# Altium footprint library Connectors_THT.PcbLib: 103 footprints (part 11 of 11)
Each footprint in its own frame and in the unit in brackets; x right, y up, seen from the top. Pads: shape width x height; smd on the part's side, far side on the other; paste and mask are expansions set on the pad; w line width, h text height; cw(c..) or ccw(c..) is an arc to the next point about the centre after c.
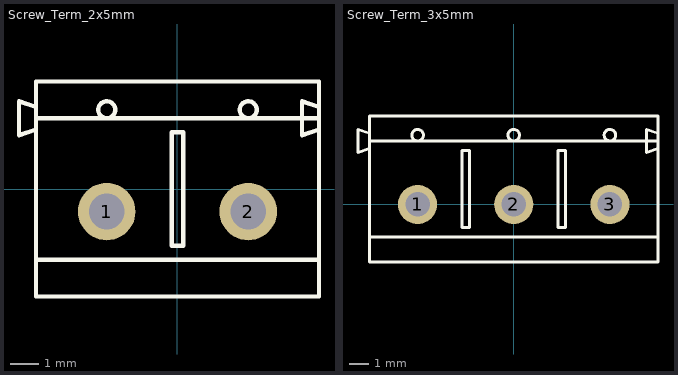
[diagram p10: the footprints below, top view; thin cyan lines are the x and y axes]

## Screw_Term_2x5mm [mil]
pads (2):
  round 80 hole 50: 1(-98.43,-31.5) 2(98.43,-31.5)
Top Overlay:
  circle w6: c-98.43,110.24 r11.81
  circle w6: c98.43,110.24 r11.81
  lines w6: -196.85,-98.43 196.85,-98.43 ; -196.85,98.43 196.85,98.43 ; -196.85,82.68 -196.85,114.17 ; -196.85,82.68 -196.85,-149.61 196.85,-149.61 196.85,82.68 ; -196.85,82.68 -220.47,74.8 -220.47,122.05 -196.85,114.17 ; -196.85,114.17 -196.85,149.61 196.85,149.61 196.85,114.17 ; 196.85,82.68 196.85,114.17 ; 196.85,82.68 173.23,74.8 173.23,122.05 196.85,114.17 ; -7.87,-78.74 -7.87,78.74 7.87,78.74 7.87,-78.74 -7.87,-78.74
3D body: height 393.7, standoff -118.11, extent -220.47,-149.6 196.86,149.61

## Screw_Term_3x5mm [mil]
pads (3):
  round 80 hole 50: 1(-196.85,0) 2(0,0) 3(196.85,0)
Top Overlay:
  circle w6: c196.85,141.73 r11.81
  circle w6: c-196.85,141.73 r11.81
  circle w6: c0,141.73 r11.81
  lines w6: -295.28,-66.93 295.28,-66.93 ; -295.28,129.92 271.65,129.92 295.28,129.92 ; -295.28,114.17 -295.28,145.67 ; -295.28,114.17 -295.28,-118.11 295.28,-118.11 295.28,114.17 ; -295.28,114.17 -318.9,106.3 -318.9,153.54 -295.28,145.67 ; -295.28,145.67 -295.28,181.1 295.28,181.1 295.28,145.67 ; 295.28,114.17 295.28,145.67 ; 295.28,114.17 271.65,106.3 271.65,153.54 295.28,145.67 ; -106.3,-47.24 -90.55,-47.24 -90.55,110.24 -106.3,110.24 -106.3,-47.24 ; 90.55,-47.24 90.55,110.24 106.3,110.24 106.3,-47.24 90.55,-47.24
3D body: height 393.7, standoff -118.11, extent -318.89,-118.1 295.29,181.11